# Altium footprint library Reflow3D1411sep.PcbLib: 657 footprints (part 38 of 42)
Each footprint in its own frame and in the unit in brackets; x right, y up, seen from the top. Pads: shape width x height; smd on the part's side, far side on the other; paste and mask are expansions set on the pad; w line width, h text height; cw(c..) or ccw(c..) is an arc to the next point about the centre after c.
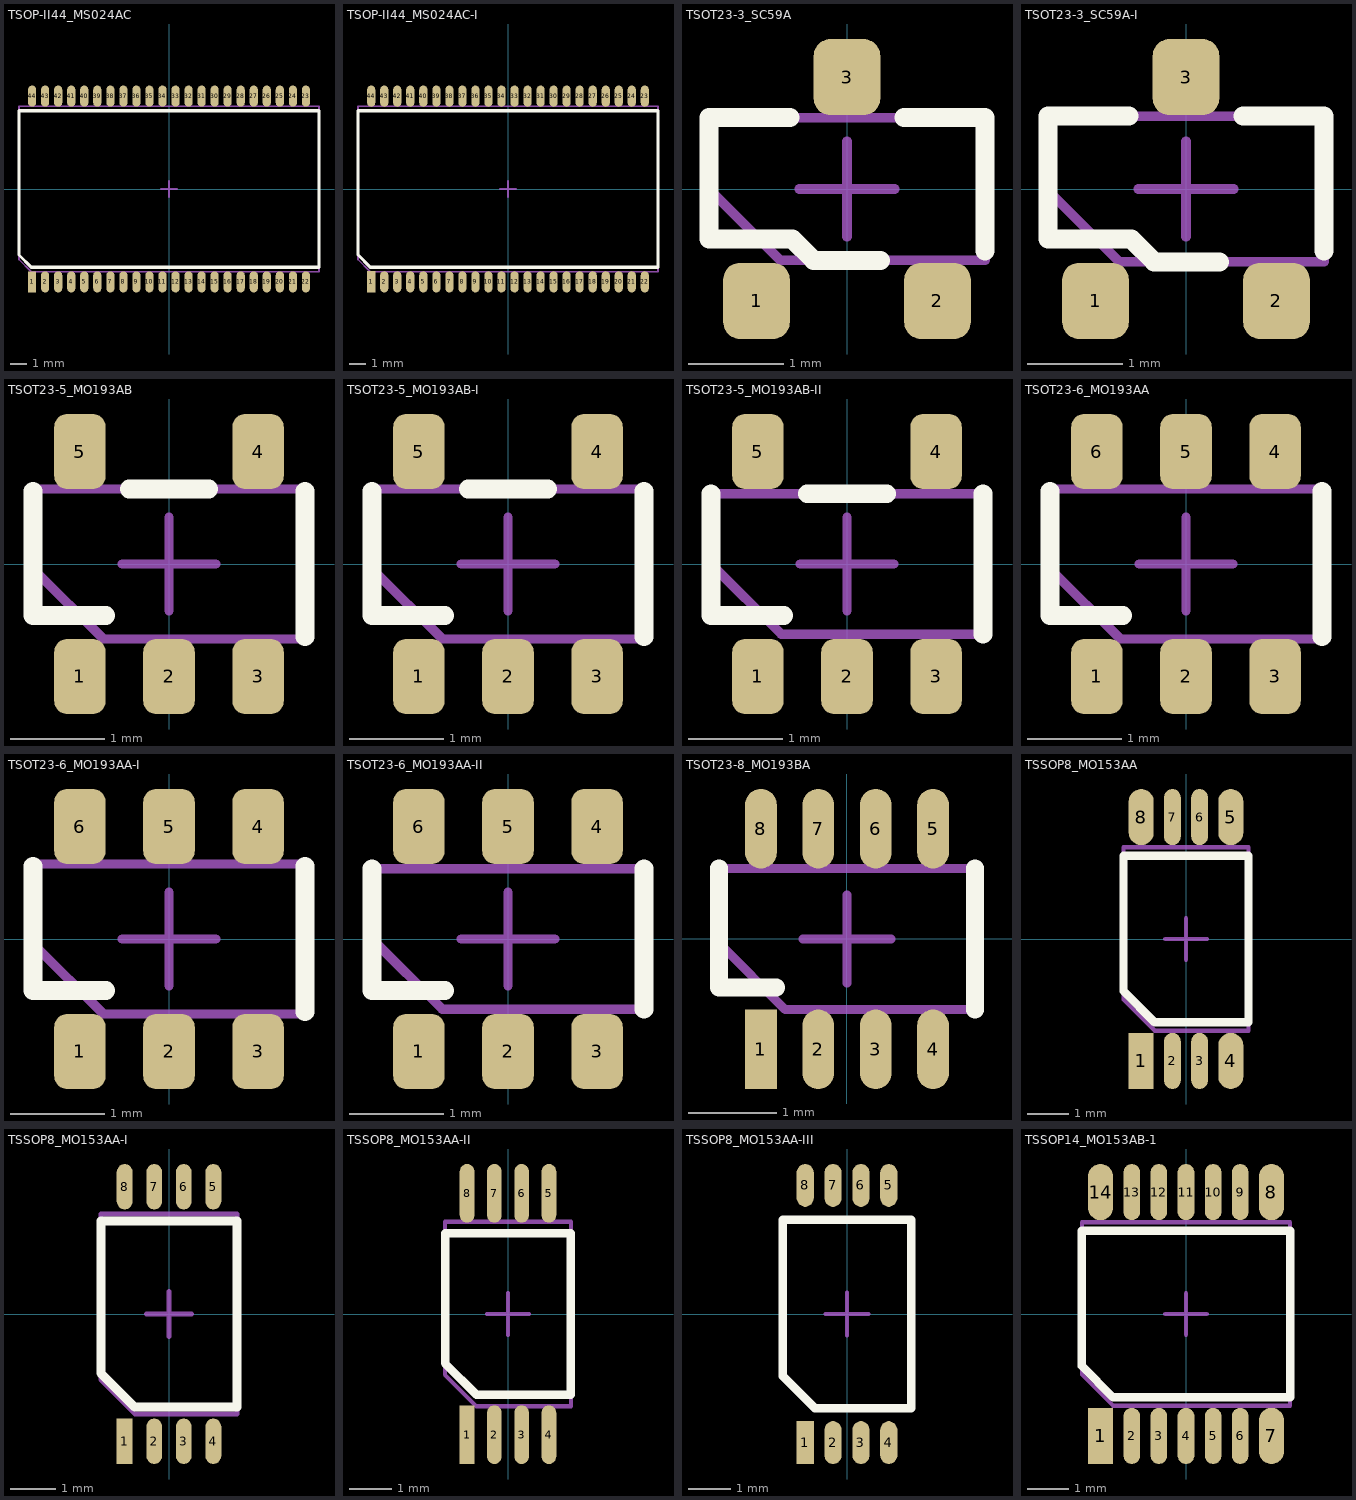
[diagram p37: the footprints below, top view; thin cyan lines are the x and y axes]

## TSOP-II44_MS024AC [mm] "www.idt.com, PSC4050.pdf; www.jedec.org, MS-024H.pdf"
height 1.1
pads (44):
  rect 0.5x1.3 smd mask+0.075: 1(-8.4,-5.7)
  oval 0.5x1.3 smd mask+0.075: 2(-7.6,-5.7) 3(-6.8,-5.7) 4(-6,-5.7) 5(-5.2,-5.7) 6(-4.4,-5.7) 7(-3.6,-5.7) 8(-2.8,-5.7) 9(-2,-5.7) 10(-1.2,-5.7) 11(-0.4,-5.7) 12(0.4,-5.7) 13(1.2,-5.7) 14(2,-5.7) 15(2.8,-5.7) 16(3.6,-5.7) 17(4.4,-5.7) 18(5.2,-5.7) 19(6,-5.7) 20(6.8,-5.7) 21(7.6,-5.7) 22(8.4,-5.7) 23(8.4,5.7) 24(7.6,5.7) 25(6.8,5.7) 26(6,5.7) 27(5.2,5.7) 28(4.4,5.7) 29(3.6,5.7) 30(2.8,5.7) 31(2,5.7) 32(1.2,5.7) 33(0.4,5.7) 34(-0.4,5.7) 35(-1.2,5.7) 36(-2,5.7) 37(-2.8,5.7) 38(-3.6,5.7) 39(-4.4,5.7) 40(-5.2,5.7) 41(-6,5.7) 42(-6.8,5.7) 43(-7.6,5.7) 44(-8.4,5.7)
Top Overlay:
  lines w0.2: -9.205,-4.05 -9.205,4.8 9.205,4.8 9.205,-4.8 -8.455,-4.8 -9.205,-4.05
Mechanical 13:
  lines w0.1: -9.205,-4.33 -8.455,-5.08 9.205,-5.08 9.205,5.08 -9.205,5.08 -9.205,-4.33
Mechanical 15:
  lines w0.1: -0.5,0 0.5,0 ; 0,-0.5 0,0.5
3D body: height 1.2, standoff 0, extent -9.27,-5.145 9.27,5.145

## TSOP-II44_MS024AC-I [mm] "www.cypress.com, 51-85087_0B_V.pdf; www.idt.com, PSC4050.pdf"
height 1.09
pads (44):
  rect 0.5x1.3 smd mask+0.075: 1(-8.4,-5.7)
  oval 0.5x1.3 smd mask+0.075: 2(-7.6,-5.7) 3(-6.8,-5.7) 4(-6,-5.7) 5(-5.2,-5.7) 6(-4.4,-5.7) 7(-3.6,-5.7) 8(-2.8,-5.7) 9(-2,-5.7) 10(-1.2,-5.7) 11(-0.4,-5.7) 12(0.4,-5.7) 13(1.2,-5.7) 14(2,-5.7) 15(2.8,-5.7) 16(3.6,-5.7) 17(4.4,-5.7) 18(5.2,-5.7) 19(6,-5.7) 20(6.8,-5.7) 21(7.6,-5.7) 22(8.4,-5.7) 23(8.4,5.7) 24(7.6,5.7) 25(6.8,5.7) 26(6,5.7) 27(5.2,5.7) 28(4.4,5.7) 29(3.6,5.7) 30(2.8,5.7) 31(2,5.7) 32(1.2,5.7) 33(0.4,5.7) 34(-0.4,5.7) 35(-1.2,5.7) 36(-2,5.7) 37(-2.8,5.7) 38(-3.6,5.7) 39(-4.4,5.7) 40(-5.2,5.7) 41(-6,5.7) 42(-6.8,5.7) 43(-7.6,5.7) 44(-8.4,5.7)
Top Overlay:
  lines w0.2: -9.21,-4.05 -9.21,4.8 9.21,4.8 9.21,-4.8 -8.46,-4.8 -9.21,-4.05
Mechanical 13:
  lines w0.1: -9.21,-4.33 -9.21,5.08 9.21,5.08 9.21,-5.08 -8.46,-5.08 -9.21,-4.33
Mechanical 15:
  lines w0.1: -0.5,0 0.5,0 ; 0,-0.5 0,0.5
3D body: height 1.19, standoff 0, extent -9.26,-5.13 9.26,5.13

## TSOT23-3_SC59A [mm] "www.nxp.com, sot346_po.pdf, SOT346_fr.pdf"
height 1.15
pads (3):
  rrect50% 0.7x0.8 smd mask+0.075: 1(-0.95,-1.175) 2(0.95,-1.175) 3(0,1.175)
Top Overlay:
  lines w0.2: -0.6,0.75 -1.45,0.75 -1.45,-0.525 -0.575,-0.525 -0.35,-0.75 0.35,-0.75 ; 0.6,0.75 1.45,0.75 1.45,-0.65
Mechanical 13:
  lines w0.1: -1.45,0 -1.45,0.75 1.45,0.75 1.45,-0.75 -0.7,-0.75 -1.45,0
Mechanical 15:
  lines w0.1: -0.5,0 0.5,0 ; 0,-0.5 0,0.5
3D body: height 1.3, standoff 0, extent -1.55,-0.85 1.55,0.85

## TSOT23-3_SC59A-I [mm] "www.nxp.com, SOT346_fr.pdf; www.jeita.or.jp, ED-7500A.pdf"
height 1.18
pads (3):
  rrect50% 0.7x0.8 smd mask+0.075: 1(-0.95,-1.175) 2(0.95,-1.175) 3(0,1.175)
Top Overlay:
  lines w0.2: -0.6,0.765 -1.45,0.765 -1.45,-0.525 -0.575,-0.525 -0.335,-0.765 0.35,-0.765 ; 0.6,0.765 1.45,0.765 1.45,-0.65
Mechanical 13:
  lines w0.1: -1.45,-0.015 -1.45,0.765 1.45,0.765 1.45,-0.765 -0.7,-0.765 -1.45,-0.015
Mechanical 15:
  lines w0.1: -0.5,0 0.5,0 ; 0,-0.5 0,0.5
3D body: height 1.45, standoff 0, extent -1.55,-0.875 1.55,0.875

## TSOT23-5_MO193AB [mm] "www.nxp.com, SOT753_fr.pdf; www.maxim-ic.com, 21-0113.PDF; www.jedec.org, Mo-193c.pdf"
height 0.95
pads (5):
  rrect50% 0.55x0.8 smd mask+0.075: 1(-0.95,-1.2) 2(0,-1.2) 3(0.95,-1.2) 4(0.95,1.2) 5(-0.95,1.2)
Top Overlay:
  lines w0.2: -1.45,0.775 -1.45,-0.55 -0.675,-0.55 ; -0.425,0.8 0.425,0.8 ; 1.45,-0.775 1.45,0.775
Mechanical 13:
  lines w0.1: -1.45,-0.05 -1.45,0.8 1.45,0.8 1.45,-0.8 -0.7,-0.8 -1.45,-0.05
Mechanical 15:
  lines w0.1: -0.5,0 0.5,0 ; 0,-0.5 0,0.5
3D body: height 1.1, standoff 0, extent -1.5,-0.825 1.5,0.825

## TSOT23-5_MO193AB-I [mm] "www.nxp.com, SOT753_fr.pdf; www.aosmd.com, SOT-23-5L.pdf"
height 0.95
pads (5):
  rrect50% 0.55x0.8 smd mask+0.075: 1(-0.95,-1.2) 2(0,-1.2) 3(0.95,-1.2) 4(0.95,1.2) 5(-0.95,1.2)
Top Overlay:
  lines w0.2: -1.45,0.775 -1.45,-0.55 -0.675,-0.55 ; -0.425,0.8 0.425,0.8 ; 1.45,-0.775 1.45,0.775
Mechanical 13:
  lines w0.1: -1.45,-0.05 -0.7,-0.8 1.45,-0.8 1.45,0.8 -1.45,0.8 -1.45,-0.05
Mechanical 15:
  lines w0.1: -0.5,0 0.5,0 ; 0,-0.5 0,0.5
3D body: height 1, standoff 0, extent -1.5,-0.85 1.5,0.85

## TSOT23-5_MO193AB-II [mm] "www.nxp.com, sot753_po.pdf, SOT753_fr.pdf"
height 1
pads (5):
  rrect50% 0.55x0.8 smd mask+0.075: 1(-0.95,-1.2) 2(0,-1.2) 3(0.95,-1.2) 4(0.95,1.2) 5(-0.95,1.2)
Top Overlay:
  lines w0.2: -1.45,0.75 -1.45,-0.55 -0.675,-0.55 ; -0.425,0.75 0.425,0.75 ; 1.45,-0.75 1.45,0.75
Mechanical 13:
  lines w0.1: -1.45,0 -0.7,-0.75 1.45,-0.75 1.45,0.75 -1.45,0.75 -1.45,0
Mechanical 15:
  lines w0.1: -0.5,0 0.5,0 ; 0,-0.5 0,0.5
3D body: height 1.1, standoff 0, extent -1.55,-0.85 1.55,0.85

## TSOT23-6_MO193AA [mm] "www.nxp.com, SOT457_fr.pdf; www.maxim-ic.com, 21-0114.PDF; www.jedec.org, Mo-193c.pdf"
height 0.95
pads (6):
  rrect50% 0.55x0.8 smd mask+0.075: 1(-0.95,-1.2) 2(0,-1.2) 3(0.95,-1.2) 4(0.95,1.2) 5(0,1.2) 6(-0.95,1.2)
Top Overlay:
  lines w0.2: -1.45,0.775 -1.45,-0.55 -0.675,-0.55 ; 1.45,-0.775 1.45,0.775
Mechanical 13:
  lines w0.1: -1.45,-0.05 -0.7,-0.8 1.45,-0.8 1.45,0.8 -1.45,0.8 -1.45,-0.05
Mechanical 15:
  lines w0.1: -0.5,0 0.5,0 ; 0,-0.5 0,0.5
3D body: height 1.1, standoff 0, extent -1.5,-0.825 1.5,0.825

## TSOT23-6_MO193AA-I [mm] "www.nxp.com, SOT457_fr.pdf; www.onsemi.com, 419AG.PDF"
height 0.82
pads (6):
  rrect50% 0.55x0.8 smd mask+0.075: 1(-0.95,-1.2) 2(0,-1.2) 3(0.95,-1.2) 4(0.95,1.2) 5(0,1.2) 6(-0.95,1.2)
Top Overlay:
  lines w0.2: -1.45,0.775 -1.45,-0.55 -0.675,-0.55 ; 1.45,-0.775 1.45,0.775
Mechanical 13:
  lines w0.1: -1.45,-0.05 -1.45,0.8 1.45,0.8 1.45,-0.8 -0.7,-0.8 -1.45,-0.05
Mechanical 15:
  lines w0.1: -0.5,0 0.5,0 ; 0,-0.5 0,0.5
3D body: height 0.9, standoff 0, extent -1.5,-0.85 1.5,0.85

## TSOT23-6_MO193AA-II [mm] "www.nxp.com, sot457_po.pdf, SOT457_fr.pdf"
height 1
pads (6):
  rrect50% 0.55x0.8 smd mask+0.075: 1(-0.95,-1.2) 2(0,-1.2) 3(0.95,-1.2) 4(0.95,1.2) 5(0,1.2) 6(-0.95,1.2)
Top Overlay:
  lines w0.2: -1.45,0.75 -1.45,-0.55 -0.675,-0.55 ; 1.45,-0.75 1.45,0.75
Mechanical 13:
  lines w0.1: -1.45,0 -1.45,0.75 1.45,0.75 1.45,-0.75 -0.7,-0.75 -1.45,0
Mechanical 15:
  lines w0.1: -0.5,0 0.5,0 ; 0,-0.5 0,0.5
3D body: height 1.1, standoff 0, extent -1.55,-0.85 1.55,0.85

## TSOT23-8_MO193BA [mm] "www.analog.com, UJ-8.pdf; www.maxim-ic.com, 21-0154A.pdf; www.jedec.org, Mo-193c.pdf"
height 0.95
pads (8):
  rect 0.36x0.9 smd mask+0.075: 1(-0.975,-1.25)
  oval 0.36x0.9 smd mask+0.075: 2(-0.325,-1.25) 3(0.325,-1.25) 4(0.975,-1.25) 5(0.975,1.25) 6(0.325,1.25) 7(-0.325,1.25) 8(-0.975,1.25)
Top Overlay:
  lines w0.2: -1.45,0.8 -1.45,-0.55 -0.8,-0.55 ; 1.45,-0.8 1.45,0.8
Mechanical 13:
  lines w0.1: -1.45,-0.05 -1.45,0.8 1.45,0.8 1.45,-0.8 -0.7,-0.8 -1.45,-0.05
Mechanical 15:
  lines w0.1: -0.5,0 0.5,0 ; 0,-0.5 0,0.5
3D body: height 1.1, standoff 0, extent -1.5,-0.825 1.5,0.825

## TSSOP8_MO153AA [mm] "www.nxp.com, sot530-1_po.pdf, sot530-1_fr.pdf"
height 1
pads (8):
  rect 0.6x1.35 smd mask+0.05: 1(-1.075,-2.925)
  oval 0.4x1.35 smd mask+0.05: 2(-0.325,-2.925) 3(0.325,-2.925) 6(0.325,2.925) 7(-0.325,2.925)
  oval 0.6x1.35 smd mask+0.05: 4(1.075,-2.925) 5(1.075,2.925) 8(-1.075,2.925)
Top Overlay:
  lines w0.2: -1.5,-1.25 -0.75,-2 1.5,-2 1.5,2 -1.5,2 -1.5,-1.25
Mechanical 13:
  lines w0.1: -1.5,-1.45 -1.5,2.2 1.5,2.2 1.5,-2.2 -0.75,-2.2 -1.5,-1.45
Mechanical 15:
  lines w0.1: -0.5,0 0.5,0 ; 0,-0.5 0,0.5
3D body: height 1.1, standoff 0, extent -1.55,-2.25 1.55,2.25

## TSSOP8_MO153AA-I [mm] "www.analog.com, 359224089841708504863856053953356548880RU08.pdf, ru-8.pdf; www.jedec.org, MO-153f.pdf"
height 1.1
pads (8):
  rect 0.35x1 smd mask+0.075: 1(-0.975,-2.8)
  oval 0.35x1 smd mask+0.075: 2(-0.325,-2.8) 3(0.325,-2.8) 4(0.975,-2.8) 5(0.975,2.8) 6(0.325,2.8) 7(-0.325,2.8) 8(-0.975,2.8)
Top Overlay:
  lines w0.2: -1.5,-1.3 -1.5,2.05 1.5,2.05 1.5,-2.05 -0.75,-2.05 -1.5,-1.3
Mechanical 13:
  lines w0.1: -1.5,-1.45 -1.5,2.2 1.5,2.2 1.5,-2.2 -0.75,-2.2 -1.5,-1.45
Mechanical 15:
  lines w0.1: -0.5,0 0.5,0 ; 0,-0.5 0,0.5
3D body: height 1.2, standoff 0, extent -1.55,-2.25 1.55,2.25

## TSSOP8_MO153AA-II [mm] "www.maxim-ic.com, 21-0175.PDF, 90-0248.PDF"
height 1
pads (8):
  rect 0.35x1.4 smd mask+0.075: 1(-0.975,-2.875)
  oval 0.35x1.4 smd mask+0.075: 2(-0.325,-2.875) 3(0.325,-2.875) 4(0.975,-2.875) 5(0.975,2.875) 6(0.325,2.875) 7(-0.325,2.875) 8(-0.975,2.875)
Top Overlay:
  lines w0.2: -1.5,-1.175 -0.75,-1.925 1.5,-1.925 1.5,1.925 -1.5,1.925 -1.5,-1.175
Mechanical 13:
  lines w0.1: -1.5,-1.45 -1.5,2.2 1.5,2.2 1.5,-2.2 -0.75,-2.2 -1.5,-1.45
Mechanical 15:
  lines w0.1: -0.5,0 0.5,0 ; 0,-0.5 0,0.5
3D body: height 1.1, standoff 0, extent -1.55,-2.25 1.55,2.25

## TSSOP8_MO153AA-III [mm] "www.aosmd.com, TSSOP-8.pdf; www.jedec.org, MO-153f.pdf"
height 1.1
pads (8):
  rect 0.4x1 smd mask+0.05: 1(-0.975,-3)
  oval 0.4x1 smd mask+0.05: 2(-0.325,-3) 3(0.325,-3) 4(0.975,-3) 5(0.975,3) 6(0.325,3) 7(-0.325,3) 8(-0.975,3)
Top Overlay:
  lines w0.2: -1.5,-1.45 -0.75,-2.2 1.5,-2.2 1.5,2.2 -1.5,2.2 -1.5,-1.45
Mechanical 13:
  lines w0.1: -1.5,-1.45 -0.75,-2.2 1.5,-2.2 1.5,2.2 -1.5,2.2 -1.5,-1.45
Mechanical 15:
  lines w0.1: -0.5,0 0.5,0 ; 0,-0.5 0,0.5
3D body: height 1.2, standoff 0, extent -1.55,-2.25 1.55,2.25

## TSSOP14_MO153AB-1 [mm] "www.nxp.com, sot402-1_po.pdf, sot402-1_fr.pdf"
height 0.98
pads (14):
  rect 0.6x1.35 smd mask+0.05: 1(-2.05,-2.925)
  oval 0.4x1.35 smd mask+0.05: 2(-1.3,-2.925) 3(-0.65,-2.925) 4(0,-2.925) 5(0.65,-2.925) 6(1.3,-2.925) 9(1.3,2.925) 10(0.65,2.925) 11(0,2.925) 12(-0.65,2.925) 13(-1.3,2.925)
  oval 0.6x1.35 smd mask+0.05: 7(2.05,-2.925) 8(2.05,2.925) 14(-2.05,2.925)
Top Overlay:
  lines w0.2: -2.5,-1.25 -2.5,2 2.5,2 2.5,-2 -1.75,-2 -2.5,-1.25
Mechanical 13:
  lines w0.1: -2.5,-1.45 -1.75,-2.2 2.5,-2.2 2.5,2.2 -2.5,2.2 -2.5,-1.45
Mechanical 15:
  lines w0.1: -0.5,0 0.5,0 ; 0,-0.5 0,0.5
3D body: height 1.1, standoff 0, extent -2.55,-2.25 2.55,2.25